# Altium integrated library WE_WR-DSUB_D-SUB Connectors_rev15a.IntLib: 64 symbols
Pins are listed as number, name and electrical type; pins without a type are passive.

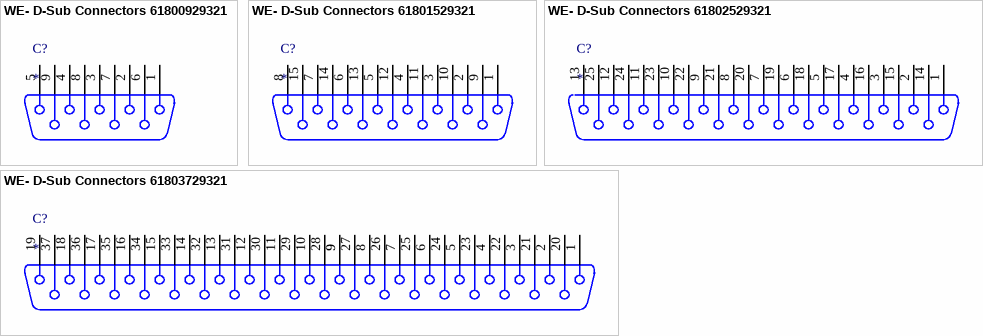
[diagram p0: symbols WE- D-Sub Connectors 61800929321 to WE- D-Sub Connectors 61803729321]

## WE- D-Sub Connectors 61800929321
designator C?
WR-DSUB Female PCB Connector; Manufacturer: Würth Elektronik eiSos GmbH; partNo: 61800929321; ComponentLink1 Description: Manufacturer; ComponentLink2 Description: Datasheet; NoPins: 9; ComponentLink1URL: http://www.we-online.de; ComponentLink2URL: http://katalog.we-online.de/em/datasheet/6180xx29321.pdf; Created by: Karrer Zheng; Created Date: 10/16/2014
footprint 61800929321
pins: 1, 2, 3, 4, 5, 6, 7, 8, 9

## WE- D-Sub Connectors 61801529321
designator C?
WR-DSUB Female PCB Connector; Manufacturer: Würth Elektronik eiSos GmbH; partNo: 61801529321; ComponentLink1 Description: Manufacturer; ComponentLink2 Description: Datasheet; NoPins: 15; ComponentLink1URL: http://www.we-online.de; ComponentLink2URL: http://katalog.we-online.de/em/datasheet/6180xx29321.pdf; Created by: Karrer Zheng; Created Date: 10/16/2014
footprint 61801529321
pins: 1, 2, 3, 4, 5, 6, 7, 8, 9, 10, 11, 12, 13, 14, 15

## WE- D-Sub Connectors 61802529321
designator C?
WR-DSUB Female PCB Connector; Manufacturer: Würth Elektronik eiSos GmbH; partNo: 61802529321; ComponentLink1 Description: Manufacturer; ComponentLink2 Description: Datasheet; NoPins: 25; ComponentLink1URL: http://www.we-online.de; ComponentLink2URL: http://katalog.we-online.de/em/datasheet/6180xx29321.pdf; Created by: Karrer Zheng; Created Date: 10/16/2014
footprint 61802529321
pins: 1, 2, 3, 4, 5, 6, 7, 8, 9, 10, 11, 12, 13, 14, 15, 16, 17, 18, 19, 20, 21, 22, 23, 24, 25

## WE- D-Sub Connectors 61803729321
designator C?
WR-DSUB Female PCB Connector; Manufacturer: Würth Elektronik eiSos GmbH; partNo: 61803729321; ComponentLink1 Description: Manufacturer; ComponentLink2 Description: Datasheet; NoPins: 37; ComponentLink1URL: http://www.we-online.de; ComponentLink2URL: http://katalog.we-online.de/em/datasheet/6180xx29321.pdf; Created by: Karrer Zheng; Created Date: 10/16/2014
footprint 61803729321
pins: 1, 2, 3, 4, 5, 6, 7, 8, 9, 9, 10, 11, 12, 13, 14, 15, 16, 17, 18, 19, 20, 21, 22, 23, 24, 25, 26, 27, 28, 29, 30, 31, 32, 33, 34, 35, 36, 37


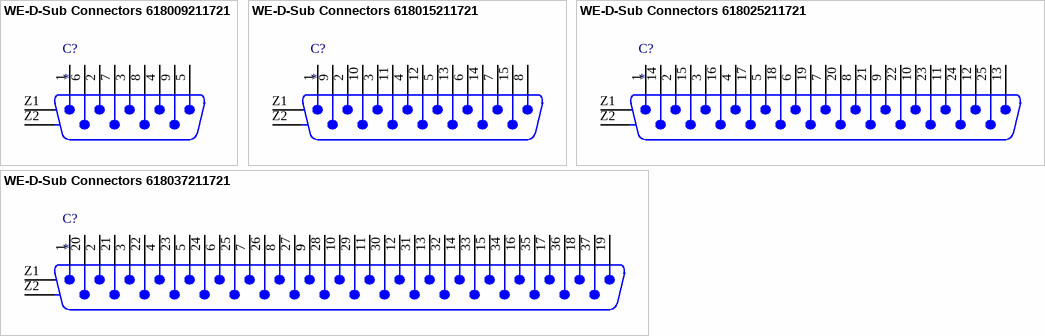
[diagram p1: symbols WE-D-Sub Connectors 618009211721 to WE-D-Sub Connectors 618037211721]

## WE-D-Sub Connectors 618009211721
designator C?
WR-DSUB Male Angled PCB Connector; Manufacturer: Würth Elektronik eiSos GmbH; partNo: 618009211721; ComponentLink1 Description: Manufacturer; ComponentLink2 Description: Datasheet; NoPins: 9; ComponentLink1URL: http://www.we-online.de; ComponentLink2URL: http://katalog.we-online.de/em/datasheet/6180xx211721.pdf; Created by: Karrer Zheng; Created Date: 10/16/2014
footprint 618009211721
pins: 1, 2, 3, 4, 5, 6, 7, 8, 9, Z1 GND, Z2 GND

## WE-D-Sub Connectors 618015211721
designator C?
WR-DSUB Male Angled PCB Connector; Manufacturer: Würth Elektronik eiSos GmbH; partNo: 618015211721; ComponentLink1 Description: Manufacturer; ComponentLink2 Description: Datasheet; NoPins: 15; ComponentLink1URL: http://www.we-online.de; ComponentLink2URL: http://katalog.we-online.de/em/datasheet/6180xx211721.pdf; Created by: Karrer Zheng; Created Date: 10/16/2014
footprint 618015211721
pins: 1, 2, 3, 4, 5, 6, 7, 8, 9, 10, 11, 12, 13, 14, 15, Z1 GND, Z2 GND

## WE-D-Sub Connectors 618025211721
designator C?
WR-DSUB Male Angled PCB Connector; Manufacturer: Würth Elektronik eiSos GmbH; partNo: 618025211721; ComponentLink1 Description: Manufacturer; ComponentLink2 Description: Datasheet; NoPins: 25; ComponentLink1URL: http://www.we-online.de; ComponentLink2URL: http://katalog.we-online.de/em/datasheet/6180xx211721.pdf; Created by: Karrer Zheng; Created Date: 10/16/2014
footprint 618025211721
pins: 1, 2, 3, 4, 5, 6, 7, 8, 9, 10, 11, 12, 13, 14, 15, 16, 17, 18, 19, 20, 21, 22, 23, 24, 25, Z1 GND, Z2 GND

## WE-D-Sub Connectors 618037211721
designator C?
WR-DSUB Male Angled PCB Connector; Manufacturer: Würth Elektronik eiSos GmbH; partNo: 618037211721; ComponentLink1 Description: Manufacturer; ComponentLink2 Description: Datasheet; NoPins: 37; ComponentLink1URL: http://www.we-online.de; ComponentLink2URL: http://katalog.we-online.de/em/datasheet/6180xx211721.pdf; Created by: Karrer Zheng; Created Date: 10/16/2014
footprint 618037211721
pins: 1, 2, 3, 4, 5, 6, 7, 8, 9, 9, 10, 11, 12, 13, 14, 15, 16, 17, 18, 19, 20, 21, 22, 23, 24, 25, 26, 27, 28, 29, 30, 31, 32, 33, 34, 35, 36, 37, Z1 GND, Z2 GND


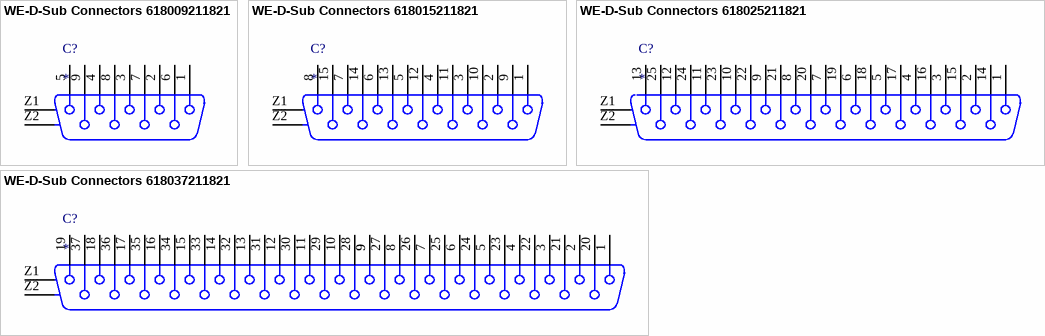
[diagram p2: symbols WE-D-Sub Connectors 618009211821 to WE-D-Sub Connectors 618037211821]

## WE-D-Sub Connectors 618009211821
designator C?
WR-DSUB Female Angled PCB Connector; Manufacturer: Würth Elektronik eiSos GmbH; partNo: 618009211821; ComponentLink1 Description: Manufacturer; ComponentLink2 Description: Datasheet; NoPins: 9; ComponentLink1URL: http://www.we-online.de; ComponentLink2URL: http://katalog.we-online.de/em/datasheet/6180xx211821.pdf; Created by: Karrer Zheng; Created Date: 10/16/2014
footprint 618009211821
pins: 1, 2, 3, 4, 5, 6, 7, 8, 9, Z1 GND, Z2 GND

## WE-D-Sub Connectors 618015211821
designator C?
WR-DSUB Female Angled PCB Connector; Manufacturer: Würth Elektronik eiSos GmbH; partNo: 618015211821; ComponentLink1 Description: Manufacturer; ComponentLink2 Description: Datasheet; NoPins: 15; ComponentLink1URL: http://www.we-online.de; ComponentLink2URL: http://katalog.we-online.de/em/datasheet/6180xx211821.pdf; Created by: Karrer Zheng; Created Date: 10/16/2014
footprint 618015211821
pins: 1, 2, 3, 4, 5, 6, 7, 8, 9, 10, 11, 12, 13, 14, 15, Z1 GND, Z2 GND

## WE-D-Sub Connectors 618025211821
designator C?
WR-DSUB Female Angled PCB Connector; Manufacturer: Würth Elektronik eiSos GmbH; partNo: 618025211821; ComponentLink1 Description: Manufacturer; ComponentLink2 Description: Datasheet; NoPins: 25; ComponentLink1URL: http://www.we-online.de; ComponentLink2URL: http://katalog.we-online.de/em/datasheet/6180xx211821.pdf; Created by: Karrer Zheng; Created Date: 10/16/2014
footprint 618025211821
pins: 1, 2, 3, 4, 5, 6, 7, 8, 9, 10, 11, 12, 13, 14, 15, 16, 17, 18, 19, 20, 21, 22, 23, 24, 25, Z1 GND, Z2 GND

## WE-D-Sub Connectors 618037211821
designator C?
WR-DSUB Female Angled PCB Connector; Manufacturer: Würth Elektronik eiSos GmbH; partNo: 618037211821; ComponentLink1 Description: Manufacturer; ComponentLink2 Description: Datasheet; NoPins: 37; ComponentLink1URL: http://www.we-online.de; ComponentLink2URL: http://katalog.we-online.de/em/datasheet/6180xx211821.pdf; Created by: Karrer Zheng; Created Date: 10/16/2014
footprint 618037211821
pins: 1, 2, 3, 4, 5, 6, 7, 8, 9, 9, 10, 11, 12, 13, 14, 15, 16, 17, 18, 19, 20, 21, 22, 23, 24, 25, 26, 27, 28, 29, 30, 31, 32, 33, 34, 35, 36, 37, Z1 GND, Z2 GND


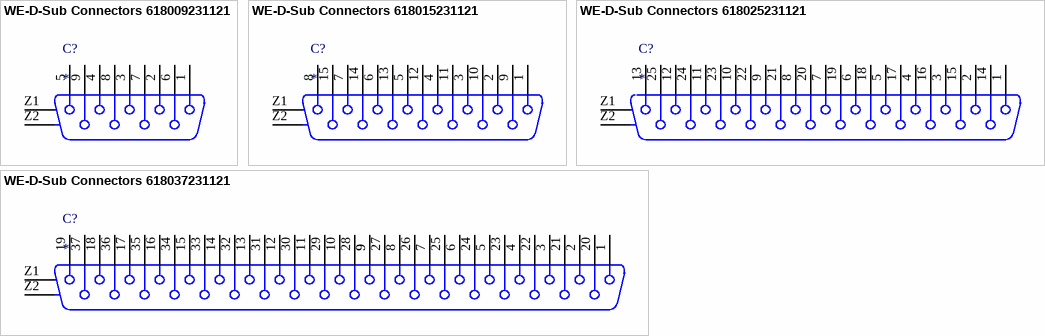
[diagram p3: symbols WE-D-Sub Connectors 618009231121 to WE-D-Sub Connectors 618037231121]

## WE-D-Sub Connectors 618009231121
designator C?
WR-DSUB Female Angled PCB Connector; Manufacturer: Würth Elektronik eiSos GmbH; partNo: 618009231121; ComponentLink1 Description: Manufacturer; ComponentLink2 Description: Datasheet; NoPins: 9; ComponentLink1URL: http://www.we-online.de; ComponentLink2URL: http://katalog.we-online.de/em/datasheet/6180xx231121.pdf; Created by: Karrer Zheng; Created Date: 10/16/2014
footprint 618009231121
pins: 1, 2, 3, 4, 5, 6, 7, 8, 9, Z1 GND, Z2 GND

## WE-D-Sub Connectors 618015231121
designator C?
WR-DSUB Female Angled PCB Connector; Manufacturer: Würth Elektronik eiSos GmbH; partNo: 618015231121; ComponentLink1 Description: Manufacturer; ComponentLink2 Description: Datasheet; NoPins: 15; ComponentLink1URL: http://www.we-online.de; ComponentLink2URL: http://katalog.we-online.de/em/datasheet/6180xx231121.pdf; Created by: Karrer Zheng; Created Date: 10/16/2014
footprint 618015231121
pins: 1, 2, 3, 4, 5, 6, 7, 8, 9, 10, 11, 12, 13, 14, 15, Z1 GND, Z2 GND

## WE-D-Sub Connectors 618025231121
designator C?
WR-DSUB Female Angled PCB Connector; Manufacturer: Würth Elektronik eiSos GmbH; partNo: 618025231121; ComponentLink1 Description: Manufacturer; ComponentLink2 Description: Datasheet; NoPins: 25; ComponentLink1URL: http://www.we-online.de; ComponentLink2URL: http://katalog.we-online.de/em/datasheet/6180xx231121.pdf; Created by: Karrer Zheng; Created Date: 10/16/2014
footprint 618025231121
pins: 1, 2, 3, 4, 5, 6, 7, 8, 9, 10, 11, 12, 13, 14, 15, 16, 17, 18, 19, 20, 21, 22, 23, 24, 25, Z1 GND, Z2 GND

## WE-D-Sub Connectors 618037231121
designator C?
WR-DSUB Female Angled PCB Connector; Manufacturer: Würth Elektronik eiSos GmbH; partNo: 618037231121; ComponentLink1 Description: Manufacturer; ComponentLink2 Description: Datasheet; NoPins: 37; ComponentLink1URL: http://www.we-online.de; ComponentLink2URL: http://katalog.we-online.de/em/datasheet/6180xx231121.pdf; Created by: Karrer Zheng; Created Date: 10/16/2014
footprint 618037231121
pins: 1, 2, 3, 4, 5, 6, 7, 8, 9, 9, 10, 11, 12, 13, 14, 15, 16, 17, 18, 19, 20, 21, 22, 23, 24, 25, 26, 27, 28, 29, 30, 31, 32, 33, 34, 35, 36, 37, Z1 GND, Z2 GND


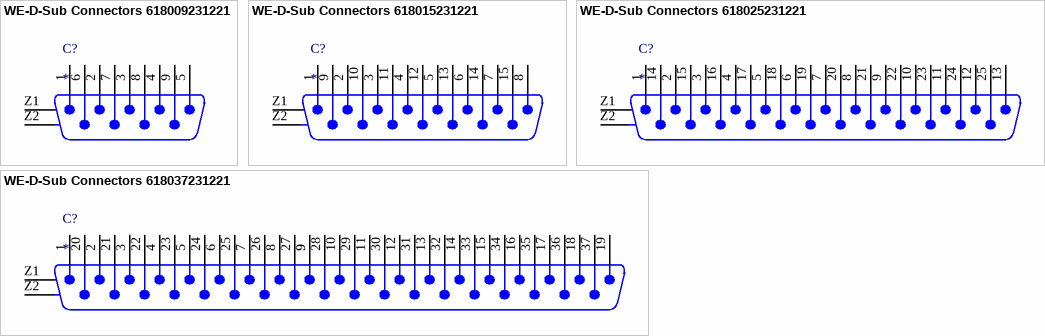
[diagram p4: symbols WE-D-Sub Connectors 618009231221 to WE-D-Sub Connectors 618037231221]

## WE-D-Sub Connectors 618009231221
designator C?
WR-DSUB Male Angled PCB Connector; Manufacturer: Würth Elektronik eiSos GmbH; partNo: 618009231221; ComponentLink1 Description: Manufacturer; ComponentLink2 Description: Datasheet; NoPins: 9; ComponentLink1URL: http://www.we-online.de; ComponentLink2URL: http://katalog.we-online.de/em/datasheet/6180xx231221.pdf; Created by: Karrer Zheng; Created Date: 10/16/2014
footprint 618009231221
pins: 1, 2, 3, 4, 5, 6, 7, 8, 9, Z1 GND, Z2 GND

## WE-D-Sub Connectors 618015231221
designator C?
WR-DSUB Male Angled PCB Connector; Manufacturer: Würth Elektronik eiSos GmbH; partNo: 618015231221; ComponentLink1 Description: Manufacturer; ComponentLink2 Description: Datasheet; NoPins: 15; ComponentLink1URL: http://www.we-online.de; ComponentLink2URL: http://katalog.we-online.de/em/datasheet/6180xx231221.pdf; Created by: Karrer Zheng; Created Date: 10/16/2014
footprint 618015231221
pins: 1, 2, 3, 4, 5, 6, 7, 8, 9, 10, 11, 12, 13, 14, 15, Z1 GND, Z2 GND

## WE-D-Sub Connectors 618025231221
designator C?
WR-DSUB Male Angled PCB Connector; Manufacturer: Würth Elektronik eiSos GmbH; partNo: 618025231221; ComponentLink1 Description: Manufacturer; ComponentLink2 Description: Datasheet; NoPins: 25; ComponentLink1URL: http://www.we-online.de; ComponentLink2URL: http://katalog.we-online.de/em/datasheet/6180xx231221.pdf; Created by: Karrer Zheng; Created Date: 10/16/2014
footprint 618025231221
pins: 1, 2, 3, 4, 5, 6, 7, 8, 9, 10, 11, 12, 13, 14, 15, 16, 17, 18, 19, 20, 21, 22, 23, 24, 25, Z1 GND, Z2 GND

## WE-D-Sub Connectors 618037231221
designator C?
WR-DSUB Male Angled PCB Connector; Manufacturer: Würth Elektronik eiSos GmbH; partNo: 618037231221; ComponentLink1 Description: Manufacturer; ComponentLink2 Description: Datasheet; NoPins: 37; ComponentLink1URL: http://www.we-online.de; ComponentLink2URL: http://katalog.we-online.de/em/datasheet/6180xx231221.pdf; Created by: Karrer Zheng; Created Date: 10/16/2014
footprint 618037231221
pins: 1, 2, 3, 4, 5, 6, 7, 8, 9, 9, 10, 11, 12, 13, 14, 15, 16, 17, 18, 19, 20, 21, 22, 23, 24, 25, 26, 27, 28, 29, 30, 31, 32, 33, 34, 35, 36, 37, Z1 GND, Z2 GND


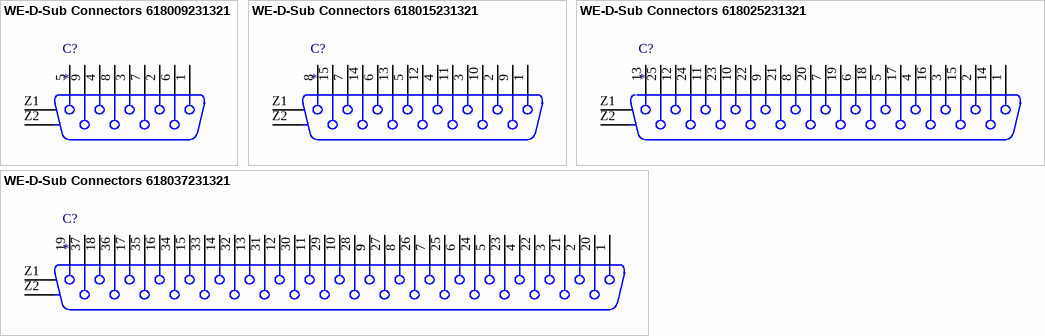
[diagram p5: symbols WE-D-Sub Connectors 618009231321 to WE-D-Sub Connectors 618037231321]

## WE-D-Sub Connectors 618009231321
designator C?
WR-DSUB Female Angled PCB Connector; Manufacturer: Würth Elektronik eiSos GmbH; partNo: 618009231321; ComponentLink1 Description: Manufacturer; ComponentLink2 Description: Datasheet; NoPins: 9; ComponentLink1URL: http://www.we-online.de; ComponentLink2URL: http://katalog.we-online.de/em/datasheet/6180xx231321.pdf; Created by: Karrer Zheng; Created Date: 10/16/2014
footprint 618009231321
pins: 1, 2, 3, 4, 5, 6, 7, 8, 9, Z1 GND, Z2 GND

## WE-D-Sub Connectors 618015231321
designator C?
WR-DSUB Female Angled PCB Connector; Manufacturer: Würth Elektronik eiSos GmbH; partNo: 618015231321; ComponentLink1 Description: Manufacturer; ComponentLink2 Description: Datasheet; NoPins: 15; ComponentLink1URL: http://www.we-online.de; ComponentLink2URL: http://katalog.we-online.de/em/datasheet/6180xx231321.pdf; Created by: Karrer Zheng; Created Date: 10/16/2014
footprint 618015231321
pins: 1, 2, 3, 4, 5, 6, 7, 8, 9, 10, 11, 12, 13, 14, 15, Z1 GND, Z2 GND

## WE-D-Sub Connectors 618025231321
designator C?
WR-DSUB Female Angled PCB Connector; Manufacturer: Würth Elektronik eiSos GmbH; partNo: 618025231321; ComponentLink1 Description: Manufacturer; ComponentLink2 Description: Datasheet; NoPins: 25; ComponentLink1URL: http://www.we-online.de; ComponentLink2URL: http://katalog.we-online.de/em/datasheet/6180xx231321.pdf; Created by: Karrer Zheng; Created Date: 10/16/2014
footprint 618025231321
pins: 1, 2, 3, 4, 5, 6, 7, 8, 9, 10, 11, 12, 13, 14, 15, 16, 17, 18, 19, 20, 21, 22, 23, 24, 25, Z1 GND, Z2 GND

## WE-D-Sub Connectors 618037231321
designator C?
WR-DSUB Female Angled PCB Connector; Manufacturer: Würth Elektronik eiSos GmbH; partNo: 618037231321; ComponentLink1 Description: Manufacturer; ComponentLink2 Description: Datasheet; NoPins: 37; ComponentLink1URL: http://www.we-online.de; ComponentLink2URL: http://katalog.we-online.de/em/datasheet/6180xx231321.pdf; Created by: Karrer Zheng; Created Date: 10/16/2014
footprint 618037231321
pins: 1, 2, 3, 4, 5, 6, 7, 8, 9, 9, 10, 11, 12, 13, 14, 15, 16, 17, 18, 19, 20, 21, 22, 23, 24, 25, 26, 27, 28, 29, 30, 31, 32, 33, 34, 35, 36, 37, Z1 GND, Z2 GND


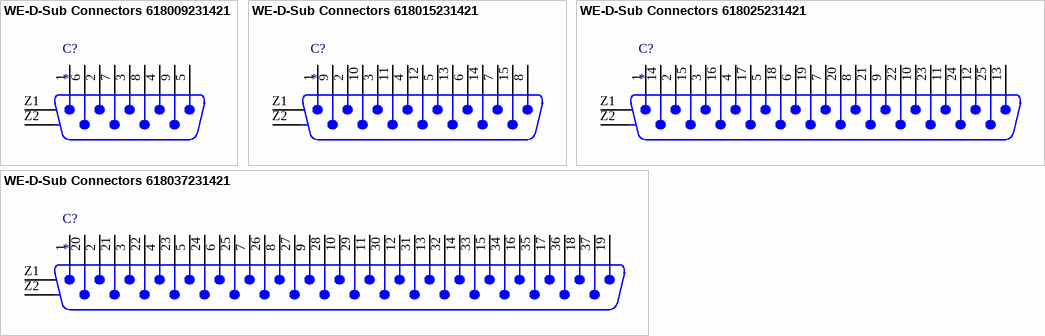
[diagram p6: symbols WE-D-Sub Connectors 618009231421 to WE-D-Sub Connectors 618037231421]

## WE-D-Sub Connectors 618009231421
designator C?
WR-DSUB Male Angled PCB Connector; Manufacturer: Würth Elektronik eiSos GmbH; partNo: 618009231421; ComponentLink1 Description: Manufacturer; ComponentLink2 Description: Datasheet; NoPins: 9; ComponentLink1URL: http://www.we-online.de; ComponentLink2URL: http://katalog.we-online.de/em/datasheet/6180xx231421.pdf; Created by: Karrer Zheng; Created Date: 10/16/2014
footprint 618009231421
pins: 1, 2, 3, 4, 5, 6, 7, 8, 9, Z1 GND, Z2 GND

## WE-D-Sub Connectors 618015231421
designator C?
WR-DSUB Male Angled PCB Connector; Manufacturer: Würth Elektronik eiSos GmbH; partNo: 618015231421; ComponentLink1 Description: Manufacturer; ComponentLink2 Description: Datasheet; NoPins: 15; ComponentLink1URL: http://www.we-online.de; ComponentLink2URL: http://katalog.we-online.de/em/datasheet/6180xx231421.pdf; Created by: Karrer Zheng; Created Date: 10/16/2014
footprint 618015231421
pins: 1, 2, 3, 4, 5, 6, 7, 8, 9, 10, 11, 12, 13, 14, 15, Z1 GND, Z2 GND

## WE-D-Sub Connectors 618025231421
designator C?
WR-DSUB Male Angled PCB Connector; Manufacturer: Würth Elektronik eiSos GmbH; partNo: 618025231421; ComponentLink1 Description: Manufacturer; ComponentLink2 Description: Datasheet; NoPins: 25; ComponentLink1URL: http://www.we-online.de; ComponentLink2URL: http://katalog.we-online.de/em/datasheet/6180xx231421.pdf; Created by: Karrer Zheng; Created Date: 10/16/2014
footprint 618025231421
pins: 1, 2, 3, 4, 5, 6, 7, 8, 9, 10, 11, 12, 13, 14, 15, 16, 17, 18, 19, 20, 21, 22, 23, 24, 25, Z1 GND, Z2 GND

## WE-D-Sub Connectors 618037231421
designator C?
WR-DSUB Male Angled PCB Connector; Manufacturer: Würth Elektronik eiSos GmbH; partNo: 618037231421; ComponentLink1 Description: Manufacturer; ComponentLink2 Description: Datasheet; NoPins: 37; ComponentLink1URL: http://www.we-online.de; ComponentLink2URL: http://katalog.we-online.de/em/datasheet/6180xx231421.pdf; Created by: Karrer Zheng; Created Date: 10/16/2014
footprint 618037231421
pins: 1, 2, 3, 4, 5, 6, 7, 8, 9, 9, 10, 11, 12, 13, 14, 15, 16, 17, 18, 19, 20, 21, 22, 23, 24, 25, 26, 27, 28, 29, 30, 31, 32, 33, 34, 35, 36, 37, Z1 GND, Z2 GND


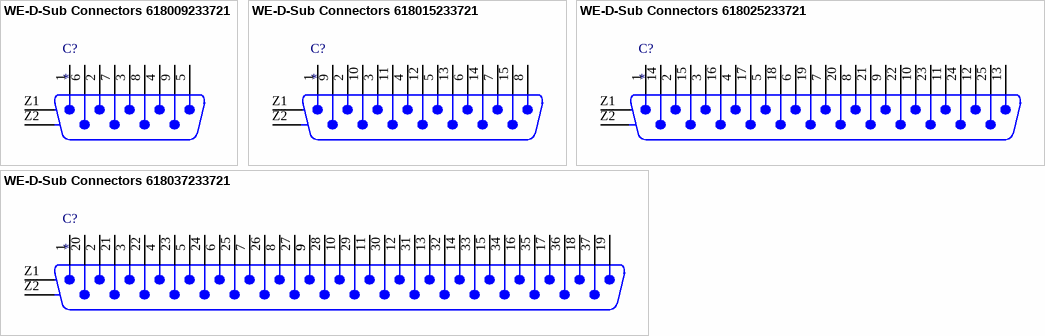
[diagram p7: symbols WE-D-Sub Connectors 618009233721 to WE-D-Sub Connectors 618037233721]

## WE-D-Sub Connectors 618009233721
designator C?
WR-DSUB Male Angled PCB Connector; Manufacturer: Würth Elektronik eiSos GmbH; partNo: 618009233721; ComponentLink1 Description: Manufacturer; ComponentLink2 Description: Datasheet; NoPins: 9; ComponentLink1URL: http://www.we-online.de; ComponentLink2URL: http://katalog.we-online.de/em/datasheet/6180xx233721.pdf; Created by: Karrer Zheng; Created Date: 10/16/2014
footprint 618009233721
pins: 1, 2, 3, 4, 5, 6, 7, 8, 9, Z1 GND, Z2 GND

## WE-D-Sub Connectors 618015233721
designator C?
WR-DSUB Male Angled PCB Connector; Manufacturer: Würth Elektronik eiSos GmbH; partNo: 618015233721; ComponentLink1 Description: Manufacturer; ComponentLink2 Description: Datasheet; NoPins: 15; ComponentLink1URL: http://www.we-online.de; ComponentLink2URL: http://katalog.we-online.de/em/datasheet/6180xx233721.pdf; Created by: Karrer Zheng; Created Date: 10/16/2014
footprint 618015233721
pins: 1, 2, 3, 4, 5, 6, 7, 8, 9, 10, 11, 12, 13, 14, 15, Z1 GND, Z2 GND

## WE-D-Sub Connectors 618025233721
designator C?
WR-DSUB Male Angled PCB Connector; Manufacturer: Würth Elektronik eiSos GmbH; partNo: 618025233721; ComponentLink1 Description: Manufacturer; ComponentLink2 Description: Datasheet; NoPins: 25; ComponentLink1URL: http://www.we-online.de; ComponentLink2URL: http://katalog.we-online.de/em/datasheet/6180xx233721.pdf; Created by: Karrer Zheng; Created Date: 10/16/2014
footprint 618025233721
pins: 1, 2, 3, 4, 5, 6, 7, 8, 9, 10, 11, 12, 13, 14, 15, 16, 17, 18, 19, 20, 21, 22, 23, 24, 25, Z1 GND, Z2 GND

## WE-D-Sub Connectors 618037233721
designator C?
WR-DSUB Male Angled PCB Connector; Manufacturer: Würth Elektronik eiSos GmbH; partNo: 618037233721; ComponentLink1 Description: Manufacturer; ComponentLink2 Description: Datasheet; NoPins: 37; ComponentLink1URL: http://www.we-online.de; ComponentLink2URL: http://katalog.we-online.de/em/datasheet/6180xx233721.pdf; Created by: Karrer Zheng; Created Date: 10/16/2014
footprint 618037233721
pins: 1, 2, 3, 4, 5, 6, 7, 8, 9, 9, 10, 11, 12, 13, 14, 15, 16, 17, 18, 19, 20, 21, 22, 23, 24, 25, 26, 27, 28, 29, 30, 31, 32, 33, 34, 35, 36, 37, Z1 GND, Z2 GND


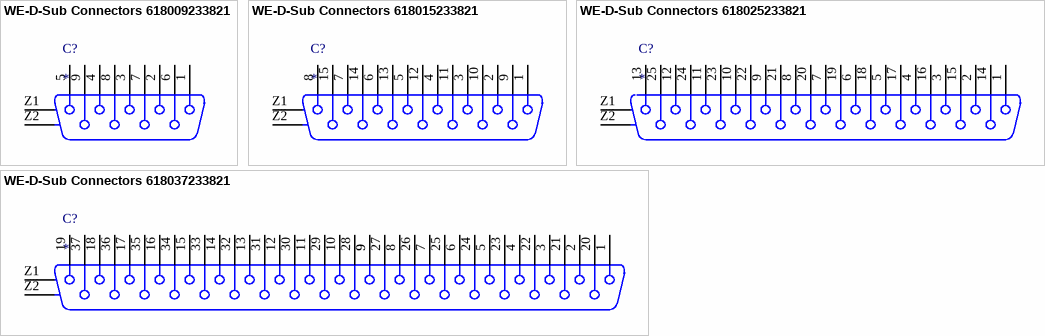
[diagram p8: symbols WE-D-Sub Connectors 618009233821 to WE-D-Sub Connectors 618037233821]

## WE-D-Sub Connectors 618009233821
designator C?
WR-DSUB Female Angled PCB Connector; Manufacturer: Würth Elektronik eiSos GmbH; partNo: 618009233821; ComponentLink1 Description: Manufacturer; ComponentLink2 Description: Datasheet; NoPins: 9; ComponentLink1URL: http://www.we-online.de; ComponentLink2URL: http://katalog.we-online.de/em/datasheet/6180xx233821.pdf; Created by: Karrer Zheng; Created Date: 10/16/2014
footprint 618009233821
pins: 1, 2, 3, 4, 5, 6, 7, 8, 9, Z1 GND, Z2 GND

## WE-D-Sub Connectors 618015233821
designator C?
WR-DSUB Female Angled PCB Connector; Manufacturer: Würth Elektronik eiSos GmbH; partNo: 618015233821; ComponentLink1 Description: Manufacturer; ComponentLink2 Description: Datasheet; NoPins: 15; ComponentLink1URL: http://www.we-online.de; ComponentLink2URL: http://katalog.we-online.de/em/datasheet/6180xx233821.pdf; Created by: Karrer Zheng; Created Date: 10/16/2014
footprint 618015233821
pins: 1, 2, 3, 4, 5, 6, 7, 8, 9, 10, 11, 12, 13, 14, 15, Z1 GND, Z2 GND

## WE-D-Sub Connectors 618025233821
designator C?
WR-DSUB Female Angled PCB Connector; Manufacturer: Würth Elektronik eiSos GmbH; partNo: 618025233821; ComponentLink1 Description: Manufacturer; ComponentLink2 Description: Datasheet; NoPins: 25; ComponentLink1URL: http://www.we-online.de; ComponentLink2URL: http://katalog.we-online.de/em/datasheet/6180xx233821.pdf; Created by: Karrer Zheng; Created Date: 10/16/2014
footprint 618025233821
pins: 1, 2, 3, 4, 5, 6, 7, 8, 9, 10, 11, 12, 13, 14, 15, 16, 17, 18, 19, 20, 21, 22, 23, 24, 25, Z1 GND, Z2 GND

## WE-D-Sub Connectors 618037233821
designator C?
WR-DSUB Female Angled PCB Connector; Manufacturer: Würth Elektronik eiSos GmbH; partNo: 618037233821; ComponentLink1 Description: Manufacturer; ComponentLink2 Description: Datasheet; NoPins: 37; ComponentLink1URL: http://www.we-online.de; ComponentLink2URL: http://katalog.we-online.de/em/datasheet/6180xx233821.pdf; Created by: Karrer Zheng; Created Date: 10/16/2014
footprint 618037233821
pins: 1, 2, 3, 4, 5, 6, 7, 8, 9, 9, 10, 11, 12, 13, 14, 15, 16, 17, 18, 19, 20, 21, 22, 23, 24, 25, 26, 27, 28, 29, 30, 31, 32, 33, 34, 35, 36, 37, Z1 GND, Z2 GND


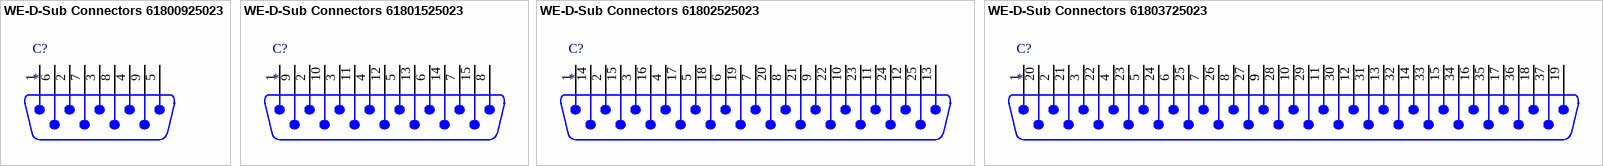
[diagram p9: symbols WE-D-Sub Connectors 61800925023 to WE-D-Sub Connectors 61803725023]

## WE-D-Sub Connectors 61800925023
designator C?
WR-DSUB Male PCB Connector; Manufacturer: Würth Elektronik eiSos GmbH; partNo: 61800925023; ComponentLink1 Description: Manufacturer; ComponentLink2 Description: Datasheet; NoPins: 9; ComponentLink1URL: http://www.we-online.de; ComponentLink2URL: http://katalog.we-online.de/em/datasheet/6180xx25023.pdf; Created by: Karrer Zheng; Created Date: 10/16/2014
footprint 61800925023
pins: 1, 2, 3, 4, 5, 6, 7, 8, 9

## WE-D-Sub Connectors 61801525023
designator C?
WR-DSUB Male PCB Connector; Manufacturer: Würth Elektronik eiSos GmbH; partNo: 61801525023; ComponentLink1 Description: Manufacturer; ComponentLink2 Description: Datasheet; NoPins: 15; ComponentLink1URL: http://www.we-online.de; ComponentLink2URL: http://katalog.we-online.de/em/datasheet/6180xx25023.pdf; Created by: Karrer Zheng; Created Date: 10/16/2014
footprint 61801525023
pins: 1, 2, 3, 4, 5, 6, 7, 8, 9, 10, 11, 12, 13, 14, 15

## WE-D-Sub Connectors 61802525023
designator C?
WR-DSUB Male PCB Connector; Manufacturer: Würth Elektronik eiSos GmbH; partNo: 61802525023; ComponentLink1 Description: Manufacturer; ComponentLink2 Description: Datasheet; NoPins: 25; ComponentLink1URL: http://www.we-online.de; ComponentLink2URL: http://katalog.we-online.de/em/datasheet/6180xx25023.pdf; Created by: Karrer Zheng; Created Date: 10/16/2014
footprint 61802525023
pins: 1, 2, 3, 4, 5, 6, 7, 8, 9, 10, 11, 12, 13, 14, 15, 16, 17, 18, 19, 20, 21, 22, 23, 24, 25

## WE-D-Sub Connectors 61803725023
designator C?
WR-DSUB Male PCB Connector; Manufacturer: Würth Elektronik eiSos GmbH; partNo: 61803725023; ComponentLink1 Description: Manufacturer; ComponentLink2 Description: Datasheet; NoPins: 37; ComponentLink1URL: http://www.we-online.de; ComponentLink2URL: http://katalog.we-online.de/em/datasheet/6180xx25023.pdf; Created by: Karrer Zheng; Created Date: 10/16/2014
footprint 61803725023
pins: 1, 2, 3, 4, 5, 6, 7, 8, 9, 9, 10, 11, 12, 13, 14, 15, 16, 17, 18, 19, 20, 21, 22, 23, 24, 25, 26, 27, 28, 29, 30, 31, 32, 33, 34, 35, 36, 37


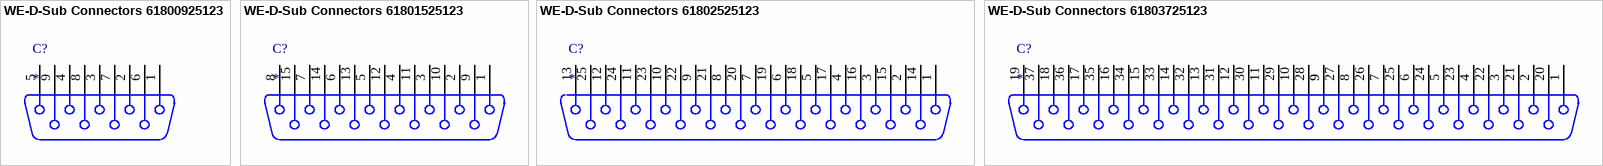
[diagram p10: symbols WE-D-Sub Connectors 61800925123 to WE-D-Sub Connectors 61803725123]

## WE-D-Sub Connectors 61800925123
designator C?
WR-DSUB Female PCB Connector; Manufacturer: Würth Elektronik eiSos GmbH; partNo: 61800925123; ComponentLink1 Description: Manufacturer; ComponentLink2 Description: Datasheet; NoPins: 9; ComponentLink1URL: http://www.we-online.de; ComponentLink2URL: http://katalog.we-online.de/em/datasheet/6180xx25123.pdf; Created by: Karrer Zheng; Created Date: 10/16/2014
footprint 61800925123 (9 pins, straight)
pins: 1, 2, 3, 4, 5, 6, 7, 8, 9

## WE-D-Sub Connectors 61801525123
designator C?
WR-DSUB Female PCB Connector; Manufacturer: Würth Elektronik eiSos GmbH; partNo: 61801525123; ComponentLink1 Description: Manufacturer; ComponentLink2 Description: Datasheet; NoPins: 15; ComponentLink1URL: http://www.we-online.de; ComponentLink2URL: http://katalog.we-online.de/em/datasheet/6180xx25123.pdf; Created by: Karrer Zheng; Created Date: 10/16/2014
footprint 61801525123
pins: 1, 2, 3, 4, 5, 6, 7, 8, 9, 10, 11, 12, 13, 14, 15

## WE-D-Sub Connectors 61802525123
designator C?
WR-DSUB Female PCB Connector; Manufacturer: Würth Elektronik eiSos GmbH; partNo: 61802525123; ComponentLink1 Description: Manufacturer; ComponentLink2 Description: Datasheet; NoPins: 25; ComponentLink1URL: http://www.we-online.de; ComponentLink2URL: http://katalog.we-online.de/em/datasheet/6180xx25123.pdf; Created by: Karrer Zheng; Created Date: 10/16/2014
footprint 61802525123
pins: 1, 2, 3, 4, 5, 6, 7, 8, 9, 10, 11, 12, 13, 14, 15, 16, 17, 18, 19, 20, 21, 22, 23, 24, 25

## WE-D-Sub Connectors 61803725123
designator C?
WR-DSUB Female PCB Connector; Manufacturer: Würth Elektronik eiSos GmbH; partNo: 61803725123; ComponentLink1 Description: Manufacturer; ComponentLink2 Description: Datasheet; NoPins: 37; ComponentLink1URL: http://www.we-online.de; ComponentLink2URL: http://katalog.we-online.de/em/datasheet/6180xx25123.pdf; Created by: Karrer Zheng; Created Date: 10/16/2014
footprint 61803725123
pins: 1, 2, 3, 4, 5, 6, 7, 8, 9, 9, 10, 11, 12, 13, 14, 15, 16, 17, 18, 19, 20, 21, 22, 23, 24, 25, 26, 27, 28, 29, 30, 31, 32, 33, 34, 35, 36, 37


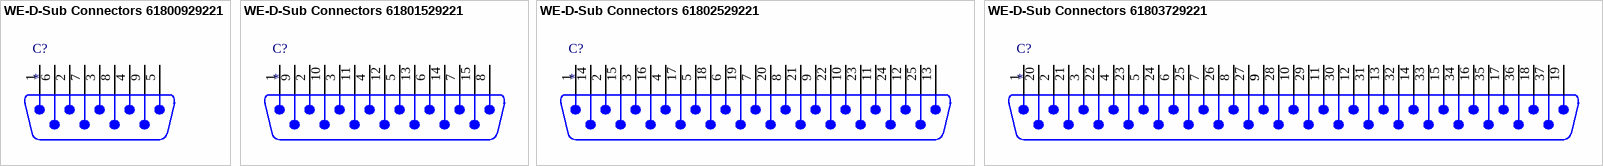
[diagram p11: symbols WE-D-Sub Connectors 61800929221 to WE-D-Sub Connectors 61803729221]

## WE-D-Sub Connectors 61800929221
designator C?
WR-DSUB Male PCB Connector; Manufacturer: Würth Elektronik eiSos GmbH; partNo: 61800929221; ComponentLink1 Description: Manufacturer; ComponentLink2 Description: Datasheet; NoPins: 9; ComponentLink1URL: http://www.we-online.de; ComponentLink2URL: http://katalog.we-online.de/em/datasheet/6180xx29221.pdf; Created by: Karrer Zheng; Created Date: 10/16/2014
footprint 61800929221
pins: 1, 2, 3, 4, 5, 6, 7, 8, 9

## WE-D-Sub Connectors 61801529221
designator C?
WR-DSUB Male PCB Connector; Manufacturer: Würth Elektronik eiSos GmbH; partNo: 61801529221; ComponentLink1 Description: Manufacturer; ComponentLink2 Description: Datasheet; NoPins: 15; ComponentLink1URL: http://www.we-online.de; ComponentLink2URL: http://katalog.we-online.de/em/datasheet/6180xx29221.pdf; Created by: Karrer Zheng; Created Date: 10/16/2014
footprint 61801529221
pins: 1, 2, 3, 4, 5, 6, 7, 8, 9, 10, 11, 12, 13, 14, 15

## WE-D-Sub Connectors 61802529221
designator C?
WR-DSUB Male PCB Connector; Manufacturer: Würth Elektronik eiSos GmbH; partNo: 61802529221; ComponentLink1 Description: Manufacturer; ComponentLink2 Description: Datasheet; NoPins: 25; ComponentLink1URL: http://www.we-online.de; ComponentLink2URL: http://katalog.we-online.de/em/datasheet/6180xx29221.pdf; Created by: Karrer Zheng; Created Date: 10/16/2014
footprint 61802529221
pins: 1, 2, 3, 4, 5, 6, 7, 8, 9, 10, 11, 12, 13, 14, 15, 16, 17, 18, 19, 20, 21, 22, 23, 24, 25

## WE-D-Sub Connectors 61803729221
designator C?
WR-DSUB Male PCB Connector; Manufacturer: Würth Elektronik eiSos GmbH; partNo: 61803729221; ComponentLink1 Description: Manufacturer; ComponentLink2 Description: Datasheet; NoPins: 37; ComponentLink1URL: http://www.we-online.de; ComponentLink2URL: http://katalog.we-online.de/em/datasheet/6180xx29221.pdf; Created by: Karrer Zheng; Created Date: 10/16/2014
footprint 61803729221
pins: 1, 2, 3, 4, 5, 6, 7, 8, 9, 9, 10, 11, 12, 13, 14, 15, 16, 17, 18, 19, 20, 21, 22, 23, 24, 25, 26, 27, 28, 29, 30, 31, 32, 33, 34, 35, 36, 37


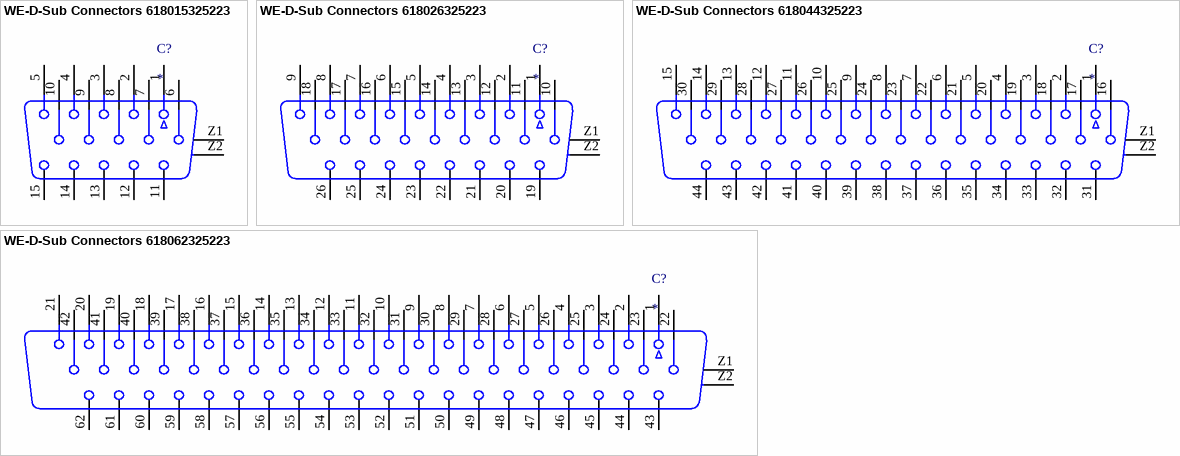
[diagram p12: symbols WE-D-Sub Connectors 618015325223 to WE-D-Sub Connectors 618062325223]

## WE-D-Sub Connectors 618015325223
designator C?
WR-DSUB Female High Density Angled PCB Connector; Manufacturer: Würth Elektronik eiSos GmbH; partNo: 618015325223; ComponentLink1 Description: Manufacturer; ComponentLink2 Description: Datasheet; NoPins: 15; ComponentLink1URL: http://www.we-online.de; ComponentLink2URL: http://katalog.we-online.de/em/datasheet/6180xx325223.pdf; Created by: Karrer Zheng; Created Date: 10/16/2014
footprint 618015325223
pins: 1, 2, 3, 4, 5, 6, 7, 8, 9, 10, 11, 12, 13, 14, 15, Z1 GND, Z2 GND

## WE-D-Sub Connectors 618026325223
designator C?
WR-DSUB Female High Density Angled PCB Connector; Manufacturer: Würth Elektronik eiSos GmbH; partNo: 618026325223; ComponentLink1 Description: Manufacturer; ComponentLink2 Description: Datasheet; NoPins: 26; ComponentLink1URL: http://www.we-online.de; ComponentLink2URL: http://katalog.we-online.de/em/datasheet/6180xx325223.pdf; Created by: Karrer Zheng; Created Date: 10/16/2014
footprint 618026325223
pins: 1, 2, 3, 4, 5, 6, 7, 8, 9, 10, 11, 12, 13, 14, 15, 16, 17, 18, 19, 20, 21, 22, 23, 24, 25, 26, Z1 GND, Z2 GND

## WE-D-Sub Connectors 618044325223
designator C?
WR-DSUB Female High Density Angled PCB Connector; Manufacturer: Würth Elektronik eiSos GmbH; partNo: 618044325223; ComponentLink1 Description: Manufacturer; ComponentLink2 Description: Datasheet; NoPins: 44; ComponentLink1URL: http://www.we-online.de; ComponentLink2URL: http://katalog.we-online.de/em/datasheet/6180xx325223.pdf; Created by: Karrer Zheng; Created Date: 10/16/2014
footprint 618044325223
pins: 1, 2, 3, 4, 5, 6, 7, 8, 9, 10, 11, 12, 13, 14, 15, 16, 17, 18, 19, 20, 21, 22, 23, 24, 25, 26, 27, 28, 29, 30, 31, 32, 33, 34, 35, 36, 37, 38, 39, 40, 41, 42, 43, 44, Z1 GND, Z2 GND

## WE-D-Sub Connectors 618062325223
designator C?
WR-DSUB Female High Density Angled PCB Connector; Manufacturer: Würth Elektronik eiSos GmbH; partNo: 618062325223; ComponentLink1 Description: Manufacturer; ComponentLink2 Description: Datasheet; NoPins: 62; ComponentLink1URL: http://www.we-online.de; ComponentLink2URL: http://katalog.we-online.de/em/datasheet/6180xx325223.pdf; Created by: Karrer Zheng; Created Date: 10/16/2014
footprint 618062325223
pins: 1, 2, 3, 4, 5, 6, 7, 8, 9, 10, 11, 12, 13, 14, 15, 16, 17, 18, 19, 20, 21, 22, 23, 24, 25, 26, 27, 28, 29, 30, 31, 32, 33, 34, 35, 36, 37, 38, 39, 40, 41, 42, 43, 44, 45, 46, 47, 48, 49, 50, 51, 52, 53, 54, 55, 56, 57, 58, 59, 60, 61, 62, Z1 GND, Z2 GND


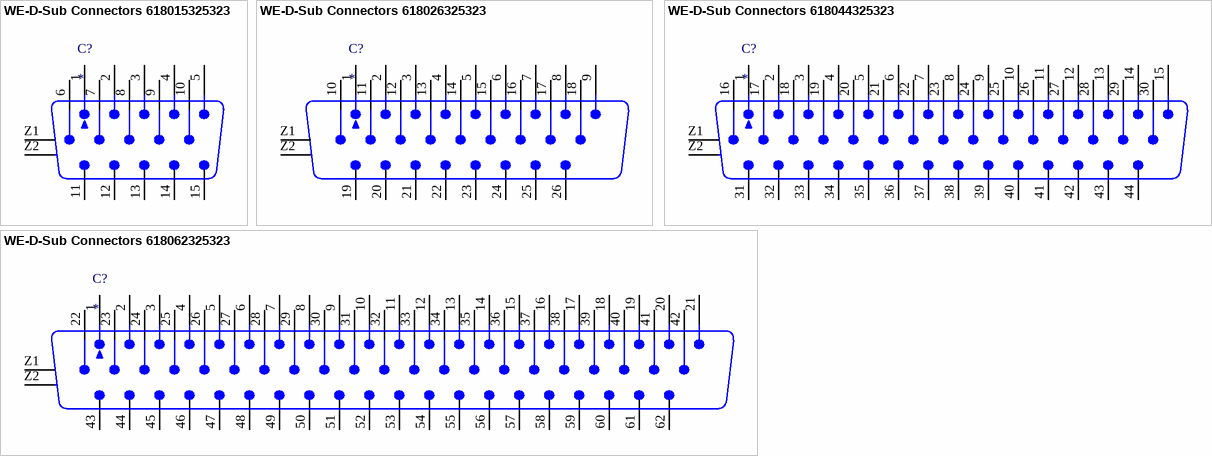
[diagram p13: symbols WE-D-Sub Connectors 618015325323 to WE-D-Sub Connectors 618062325323]

## WE-D-Sub Connectors 618015325323
designator C?
WR-DSUB Male High Density Angled PCB Connector; Manufacturer: Würth Elektronik eiSos GmbH; partNo: 618015325323; ComponentLink1 Description: Manufacturer; ComponentLink2 Description: Datasheet; NoPins: 15; ComponentLink1URL: http://www.we-online.de; ComponentLink2URL: http://katalog.we-online.de/em/datasheet/6180xx325323.pdf; Created by: Karrer Zheng; Created Date: 10/16/2014
footprint 618015325323
pins: 1, 2, 3, 4, 5, 6, 7, 8, 9, 10, 11, 12, 13, 14, 15, Z1 GND, Z2 GND

## WE-D-Sub Connectors 618026325323
designator C?
WR-DSUB Male High Density Angled PCB Connector; Manufacturer: Würth Elektronik eiSos GmbH; partNo: 618026325323; ComponentLink1 Description: Manufacturer; ComponentLink2 Description: Datasheet; NoPins: 26; ComponentLink1URL: http://www.we-online.de; ComponentLink2URL: http://katalog.we-online.de/em/datasheet/6180xx325323.pdf; Created by: Karrer Zheng; Created Date: 10/16/2014
footprint 618026325323
pins: 1, 2, 3, 4, 5, 6, 7, 8, 9, 10, 11, 12, 13, 14, 15, 16, 17, 18, 19, 20, 21, 22, 23, 24, 25, 26, Z1 GND, Z2 GND

## WE-D-Sub Connectors 618044325323
designator C?
WR-DSUB Male High Density Angled PCB Connector; Manufacturer: Würth Elektronik eiSos GmbH; partNo: 618044325323; ComponentLink1 Description: Manufacturer; ComponentLink2 Description: Datasheet; NoPins: 44; ComponentLink1URL: http://www.we-online.de; ComponentLink2URL: http://katalog.we-online.de/em/datasheet/6180xx325323.pdf; Created by: Karrer Zheng; Created Date: 10/16/2014
footprint 618044325323
pins: 1, 2, 3, 4, 5, 6, 7, 8, 9, 10, 11, 12, 13, 14, 15, 16, 17, 18, 19, 20, 21, 22, 23, 24, 25, 26, 27, 28, 29, 30, 31, 32, 33, 34, 35, 36, 37, 38, 39, 40, 41, 42, 43, 44, Z1 GND, Z2 GND

## WE-D-Sub Connectors 618062325323
designator C?
WR-DSUB Male High Density Angled PCB Connector; Manufacturer: Würth Elektronik eiSos GmbH; partNo: 618062325323; ComponentLink1 Description: Manufacturer; ComponentLink2 Description: Datasheet; NoPins: 62; ComponentLink1URL: http://www.we-online.de; ComponentLink2URL: http://katalog.we-online.de/em/datasheet/6180xx325323.pdf; Created by: Karrer Zheng; Created Date: 10/16/2014
footprint 618062325323
pins: 1, 2, 3, 4, 5, 6, 7, 8, 9, 10, 11, 12, 13, 14, 15, 16, 17, 18, 19, 20, 21, 22, 23, 24, 25, 26, 27, 28, 29, 30, 31, 32, 33, 34, 35, 36, 37, 38, 39, 40, 41, 42, 43, 44, 45, 46, 47, 48, 49, 50, 51, 52, 53, 54, 55, 56, 57, 58, 59, 60, 61, 62, Z1 GND, Z2 GND


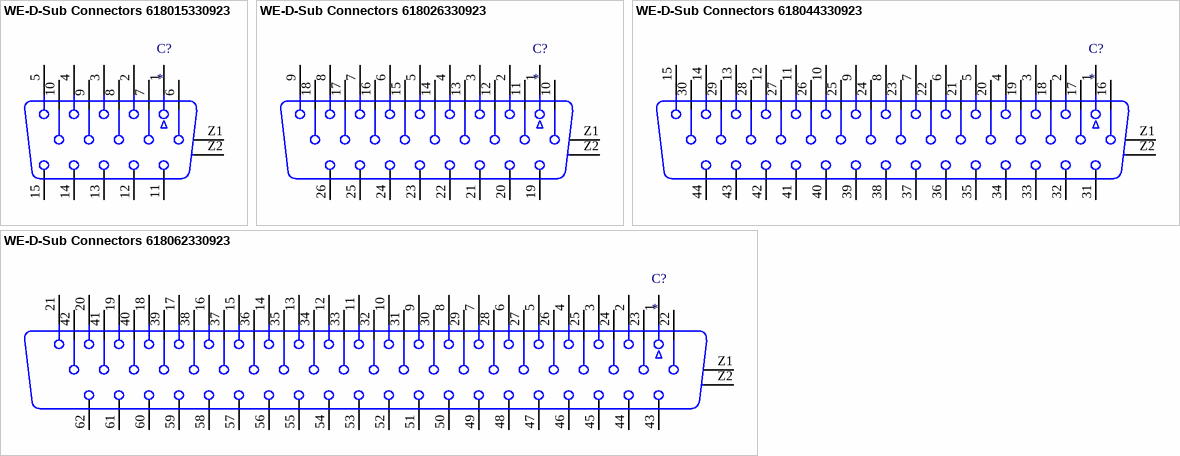
[diagram p14: symbols WE-D-Sub Connectors 618015330923 to WE-D-Sub Connectors 618062330923]

## WE-D-Sub Connectors 618015330923
designator C?
WR-DSUB Female High Density Angled PCB Connector; Manufacturer: Würth Elektronik eiSos GmbH; partNo: 618015330923; ComponentLink1 Description: Manufacturer; ComponentLink2 Description: Datasheet; NoPins: 15; ComponentLink1URL: http://www.we-online.de; ComponentLink2URL: http://katalog.we-online.de/em/datasheet/6180xx330923.pdf; Created by: Karrer Zheng; Created Date: 10/16/2014
footprint 618015330923
pins: 1, 2, 3, 4, 5, 6, 7, 8, 9, 10, 11, 12, 13, 14, 15, Z1 GND, Z2 GND

## WE-D-Sub Connectors 618026330923
designator C?
WR-DSUB Female High Density Angled PCB Connector; Manufacturer: Würth Elektronik eiSos GmbH; partNo: 618026330923; ComponentLink1 Description: Manufacturer; ComponentLink2 Description: Datasheet; NoPins: 26; ComponentLink1URL: http://www.we-online.de; ComponentLink2URL: http://katalog.we-online.de/em/datasheet/6180xx330923.pdf; Created by: Karrer Zheng; Created Date: 10/16/2014
footprint 618026330923
pins: 1, 2, 3, 4, 5, 6, 7, 8, 9, 10, 11, 12, 13, 14, 15, 16, 17, 18, 19, 20, 21, 22, 23, 24, 25, 26, Z1 GND, Z2 GND

## WE-D-Sub Connectors 618044330923
designator C?
WR-DSUB Female High Density Angled PCB Connector; Manufacturer: Würth Elektronik eiSos GmbH; partNo: 618044330923; ComponentLink1 Description: Manufacturer; ComponentLink2 Description: Datasheet; NoPins: 44; ComponentLink1URL: http://www.we-online.de; ComponentLink2URL: http://katalog.we-online.de/em/datasheet/6180xx330923.pdf; Created by: Karrer Zheng; Created Date: 10/16/2014
footprint 618044330923
pins: 1, 2, 3, 4, 5, 6, 7, 8, 9, 10, 11, 12, 13, 14, 15, 16, 17, 18, 19, 20, 21, 22, 23, 24, 25, 26, 27, 28, 29, 30, 31, 32, 33, 34, 35, 36, 37, 38, 39, 40, 41, 42, 43, 44, Z1 GND, Z2 GND

## WE-D-Sub Connectors 618062330923
designator C?
WR-DSUB Female High Density Angled PCB Connector; Manufacturer: Würth Elektronik eiSos GmbH; partNo: 618062330923; ComponentLink1 Description: Manufacturer; ComponentLink2 Description: Datasheet; NoPins: 62; ComponentLink1URL: http://www.we-online.de; ComponentLink2URL: http://katalog.we-online.de/em/datasheet/6180xx330923.pdf; Created by: Karrer Zheng; Created Date: 10/16/2014
footprint 618062330923
pins: 1, 2, 3, 4, 5, 6, 7, 8, 9, 10, 11, 12, 13, 14, 15, 16, 17, 18, 19, 20, 21, 22, 23, 24, 25, 26, 27, 28, 29, 30, 31, 32, 33, 34, 35, 36, 37, 38, 39, 40, 41, 42, 43, 44, 45, 46, 47, 48, 49, 50, 51, 52, 53, 54, 55, 56, 57, 58, 59, 60, 61, 62, Z1 GND, Z2 GND


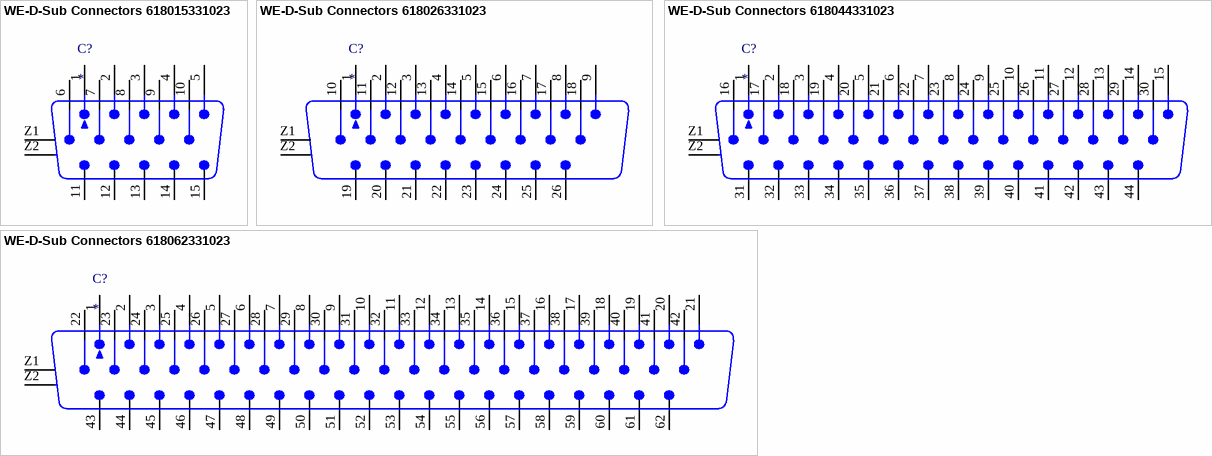
[diagram p15: symbols WE-D-Sub Connectors 618015331023 to WE-D-Sub Connectors 618062331023]

## WE-D-Sub Connectors 618015331023
designator C?
WR-DSUB Male High Density Angled PCB Connector; Manufacturer: Würth Elektronik eiSos GmbH; partNo: 618015331023; ComponentLink1 Description: Manufacturer; ComponentLink2 Description: Datasheet; NoPins: 15; ComponentLink1URL: http://www.we-online.de; ComponentLink2URL: http://katalog.we-online.de/em/datasheet/6180xx331023.pdf; Created by: Karrer Zheng; Created Date: 10/16/2014
footprint 618015331023
pins: 1, 2, 3, 4, 5, 6, 7, 8, 9, 10, 11, 12, 13, 14, 15, Z1 GND, Z2 GND

## WE-D-Sub Connectors 618026331023
designator C?
WR-DSUB Male High Density Angled PCB Connector; Manufacturer: Würth Elektronik eiSos GmbH; partNo: 618026331023; ComponentLink1 Description: Manufacturer; ComponentLink2 Description: Datasheet; NoPins: 26; ComponentLink1URL: http://www.we-online.de; ComponentLink2URL: http://katalog.we-online.de/em/datasheet/6180xx331023.pdf; Created by: Karrer Zheng; Created Date: 10/16/2014
footprint 618026331023
pins: 1, 2, 3, 4, 5, 6, 7, 8, 9, 10, 11, 12, 13, 14, 15, 16, 17, 18, 19, 20, 21, 22, 23, 24, 25, 26, Z1 GND, Z2 GND

## WE-D-Sub Connectors 618044331023
designator C?
WR-DSUB Male High Density Angled PCB Connector; Manufacturer: Würth Elektronik eiSos GmbH; partNo: 618044331023; ComponentLink1 Description: Manufacturer; ComponentLink2 Description: Datasheet; NoPins: 44; ComponentLink1URL: http://www.we-online.de; ComponentLink2URL: http://katalog.we-online.de/em/datasheet/6180xx331023.pdf; Created by: Karrer Zheng; Created Date: 10/16/2014
footprint 618044331023
pins: 1, 2, 3, 4, 5, 6, 7, 8, 9, 10, 11, 12, 13, 14, 15, 16, 17, 18, 19, 20, 21, 22, 23, 24, 25, 26, 27, 28, 29, 30, 31, 32, 33, 34, 35, 36, 37, 38, 39, 40, 41, 42, 43, 44, Z1 GND, Z2 GND

## WE-D-Sub Connectors 618062331023
designator C?
WR-DSUB Male High Density Angled PCB Connector; Manufacturer: Würth Elektronik eiSos GmbH; partNo: 618062331023; ComponentLink1 Description: Manufacturer; ComponentLink2 Description: Datasheet; NoPins: 62; ComponentLink1URL: http://www.we-online.de; ComponentLink2URL: http://katalog.we-online.de/em/datasheet/6180xx331023.pdf; Created by: Karrer Zheng; Created Date: 10/16/2014
footprint 618062331023
pins: 1, 2, 3, 4, 5, 6, 7, 8, 9, 10, 11, 12, 13, 14, 15, 16, 17, 18, 19, 20, 21, 22, 23, 24, 25, 26, 27, 28, 29, 30, 31, 32, 33, 34, 35, 36, 37, 38, 39, 40, 41, 42, 43, 44, 45, 46, 47, 48, 49, 50, 51, 52, 53, 54, 55, 56, 57, 58, 59, 60, 61, 62, Z1 GND, Z2 GND